# Altium integrated library Chip.IntLib: 52 symbols
Pins are listed as number, name and electrical type; pins without a type are passive.

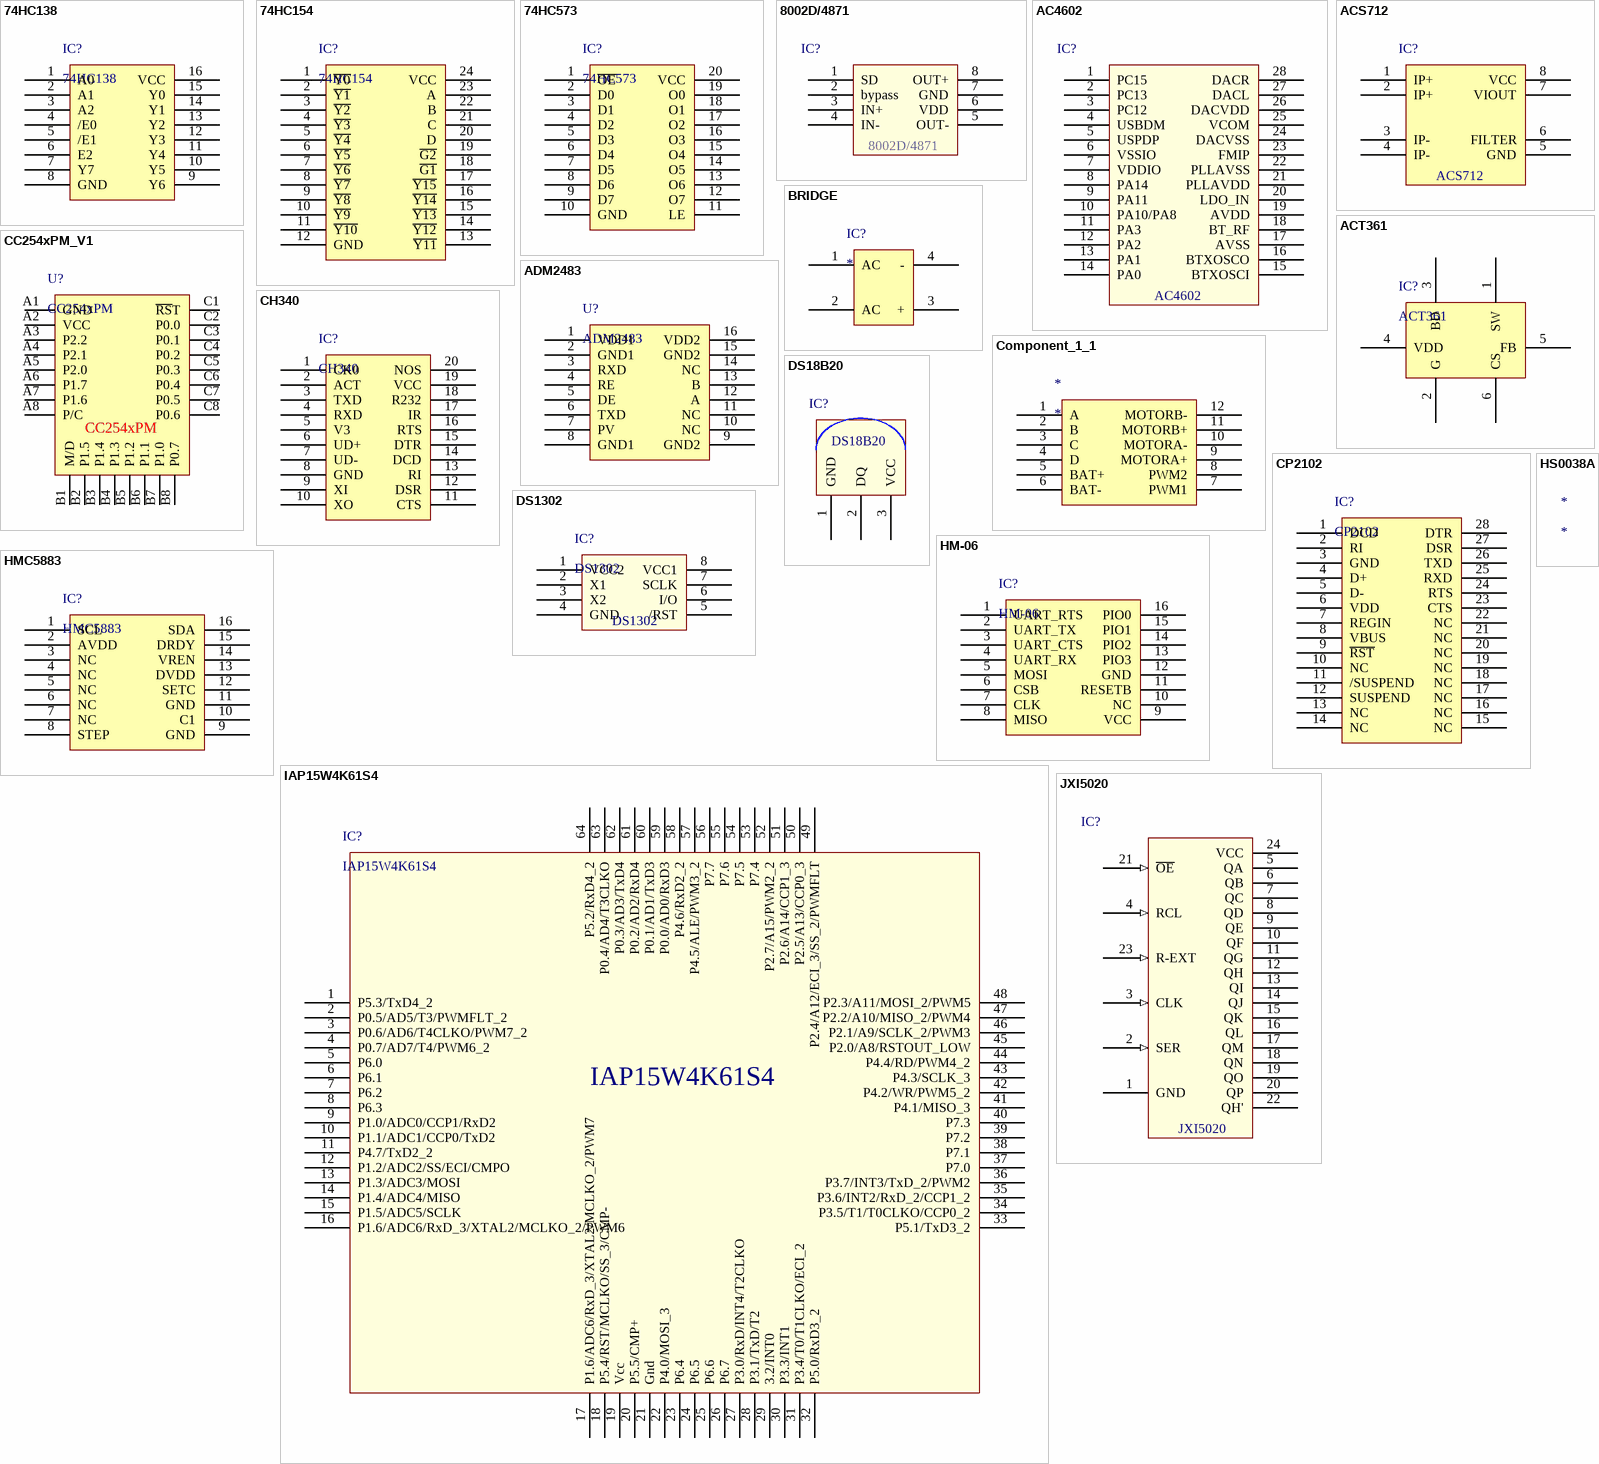
[diagram p0: symbols 74HC138 to JXI5020]

## 74HC138
designator IC?
三八译码器
footprint SOP16_39
pins: 1 A0, 2 A1, 3 A2, 4 /E0, 5 /E1, 6 E2, 7 Y7, 8 GND, 9 Y6, 10 Y5, 11 Y4, 12 Y3, 13 Y2, 14 Y1, 15 Y0, 16 VCC

## 74HC154
designator IC?
4-16译码器
pins: 1 ~{Y0}, 2 ~{Y1}, 3 ~{Y2}, 4 ~{Y3}, 5 ~{Y4}, 6 ~{Y5}, 7 ~{Y6}, 8 ~{Y7}, 9 ~{Y8}, 10 ~{Y9}, 11 ~{Y10}, 12 GND, 13 ~{Y11}, 14 ~{Y12}, 15 ~{Y13}, 16 ~{Y14}, 17 ~{Y15}, 18 ~{G1}, 19 ~{G2}, 20 D, 21 C, 22 B, 23 A, 24 VCC

## 74HC573
designator IC?
锁存器
footprint SOP20_75
pins: 1 ~{OE}, 2 D0, 3 D1, 4 D2, 5 D3, 6 D4, 7 D5, 8 D6, 9 D7, 10 GND, 11 LE, 12 O7, 13 O6, 14 O5, 15 O4, 16 O3, 17 O2, 18 O1, 19 O0, 20 VCC

## 8002D/4871
designator IC?  (value not drawn)
功放
footprint SOP8_39
pins: 1 SD, 2 bypass, 3 IN+, 4 IN-, 5 OUT-, 6 VDD, 7 GND, 8 OUT+

## AC4602
designator IC?  (value not drawn)
蓝牙芯片
footprint SSOP28
pins: 1 PC15, 2 PC13, 3 PC12, 4 USBDM, 5 USPDP, 6 VSSIO, 7 VDDIO, 8 PA14, 9 PA11, 10 PA10/PA8, 11 PA3, 12 PA2, 13 PA1, 14 PA0, 15 BTXOSCI, 16 BTXOSCO, 17 AVSS, 18 BT_RF, 19 AVDD, 20 LDO_IN, 21 PLLAVDD, 22 PLLAVSS, 23 FMIP, 24 DACVSS, 25 VCOM, 26 DACVDD, 27 DACL, 28 DACR

## ACS712
designator IC?  (value not drawn)
电流传感器
footprint SOP8_39
pins: 1 IP+, 2 IP+, 3 IP-, 4 IP-, 5 GND, 6 FILTER, 7 VIOUT, 8 VCC

## ACT361
designator IC?
开关稳压器
pins: 1 SW, 2 G, 3 BD, 4 VDD, 5 FB, 6 CS

## ADM2483
designator U?
隔离485
footprint SOP16_75
pins: 1 VDD1, 2 GND1, 3 RXD, 4 RE, 5 DE, 6 TXD, 7 PV, 8 GND1, 9 GND2, 10 NC, 11 NC, 12 A, 13 B, 14 NC, 15 GND2, 16 VDD2

## BRIDGE
designator IC?
整流桥
footprint MB6S
pins: 1 AC, 2 AC, 3 +, 4 -

## CC254xPM_V1
designator U?, comment CC254xPM
蓝牙4.0
footprint CC254xPMV1
footprint CC254xPMv2
pins: A1 GND, A2 VCC, A3 P2.2, A4 P2.1, A5 P2.0, A6 P1.7, A7 P1.6, A8 P/C, B1 M/D, B2 P1.5, B3 P1.4, B4 P1.3, B5 P1.2, B6 P1.1, B7 P1.0, B8 P0.7, C1 ~{RS}T, C2 P0.0, C3 P0.1, C4 P0.2, C5 P0.3, C6 P0.4, C7 P0.5, C8 P0.6

## CH340
designator IC?
串口转换
footprint SSOP20
pins: 1 CK0, 2 ACT, 3 TXD, 4 RXD, 5 V3, 6 UD+, 7 UD-, 8 GND, 9 XI, 10 XO, 11 CTS, 12 DSR, 13 RI, 14 DCD, 15 DTR, 16 RTS, 17 IR, 18 R232, 19 VCC, 20 NOS

## Component_1_1
designator *
pins: 1 A, 2 B, 3 C, 4 D, 5 BAT+, 6 BAT-, 7 PWM1, 8 PWM2, 9 MOTORA+, 10 MOTORA-, 11 MOTORB+, 12 MOTORB-

## CP2102
designator IC?
串口转换
footprint QFN28
pins: 1 DCD, 2 RI, 3 GND, 4 D+, 5 D-, 6 VDD, 7 REGIN, 8 VBUS, 9 ~{RST}, 10 NC, 11 /SUSPEND, 12 SUSPEND, 13 NC, 14 NC, 15 NC, 16 NC, 17 NC, 18 NC, 19 NC, 20 NC, 21 NC, 22 NC, 23 CTS, 24 RTS, 25 RXD, 26 TXD, 27 DSR, 28 DTR

## DS18B20
designator IC?  (value not drawn)
温度传感器
footprint TO-92
pins: 1 GND, 2 DQ, 3 VCC

## DS1302
designator IC?
时钟芯片
footprint SOP8_39
pins: 1 VCC2, 2 X1, 3 X2, 4 GND, 5 /RST, 6 I/O (oe), 7 SCLK (oe), 8 VCC1 (oe)

## HM-06
designator IC?
蓝牙模块
footprint HM-06
pins: 1 UART_RTS, 2 UART_TX, 3 UART_CTS, 4 UART_RX, 5 MOSI, 6 CSB, 7 CLK, 8 MISO, 9 VCC, 10 NC, 11 RESETB, 12 GND, 13 PIO3, 14 PIO2, 15 PIO1, 16 PIO0

## HMC5883
designator IC?
电子罗盘
footprint LCC16 (LCC, 16-Pins, Body 3.0x3.0mm (max), Pitch 0.50mm, IPC Medium Density)
pins: 1 SCL, 2 AVDD, 3 NC, 4 NC, 5 NC, 6 NC, 7 NC, 8 STEP, 9 GND, 10 C1, 11 GND, 12 SETC, 13 DVDD, 14 VREN, 15 DRDY, 16 SDA

## HS0038A
designator *

## IAP15W4K61S4
designator IC?
单片机
footprint LQFP64
pins: 1 P5.3/TxD4_2, 2 P0.5/AD5/T3/PWMFLT_2, 3 P0.6/AD6/T4CLKO/PWM7_2, 4 P0.7/AD7/T4/PWM6_2, 5 P6.0, 6 P6.1, 7 P6.2, 8 P6.3, 9 P1.0/ADC0/CCP1/RxD2, 10 P1.1/ADC1/CCP0/TxD2, 11 P4.7/TxD2_2, 12 P1.2/ADC2/SS/ECI/CMPO, 13 P1.3/ADC3/MOSI, 14 P1.4/ADC4/MISO, 15 P1.5/ADC5/SCLK, 16 P1.6/ADC6/RxD_3/XTAL2/MCLKO_2/PWM6, 17 P1.6/ADC6/RxD_3/XTAL2/MCLKO_2/PWM7, 18 P5.4/RST/MCLKO/SS_3/CMP-, 19 Vcc, 20 P5.5/CMP+, 21 Gnd, 22 P4.0/MOSI_3, 23 P6.4, 24 P6.5, 25 P6.6, 26 P6.7, 27 P3.0/RxD/INT4/T2CLKO, 28 P3.1/TxD/T2, 29 3.2/INT0, 30 P3.3/INT1, 31 P3.4/T0/T1CLKO/ECI_2, 32 P5.0/RxD3_2, 33 P5.1/TxD3_2, 34 P3.5/T1/T0CLKO/CCP0_2, 35 P3.6/INT2/RxD_2/CCP1_2, 36 P3.7/INT3/TxD_2/PWM2, 37 P7.0, 38 P7.1, 39 P7.2, 40 P7.3, 41 P4.1/MISO_3, 42 P4.2/WR/PWM5_2, 43 P4.3/SCLK_3, 44 P4.4/RD/PWM4_2, 45 P2.0/A8/RSTOUT_LOW, 46 P2.1/A9/SCLK_2/PWM3, 47 P2.2/A10/MISO_2/PWM4, 48 P2.3/A11/MOSI_2/PWM5, 49 P2.4/A12/ECI_3/SS_2/PWMFLT, 50 P2.5/A13/CCP0_3, 51 P2.6/A14/CCP1_3, 52 P2.7/A15/PWM2_2, 53 P7.4, 54 P7.5, 55 P7.6, 56 P7.7, 57 P4.5/ALE/PWM3_2, 58 P4.6/RxD2_2, 59 P0.0/AD0/RxD3, 60 P0.1/AD1/TxD3, 61 P0.2/AD2/RxD4, 62 P0.3/AD3/TxD4, 63 P0.4/AD4/T3CLKO, 64 P5.2/RxD4_2

## JXI5020
designator IC?  (value not drawn)
16位恒流驱动
footprint JXI5020 (SOP, 24-Leads, Body 13.0x6.0mm (max), Pitch 1.00mm, IPC Medium Density)
pins: 1 GND, 2 SER (in), 3 CLK (in), 4 RCL (in), 5 QA, 6 QB, 7 QC, 8 QD, 9 QE, 10 QF, 11 QG, 12 QH, 13 QI, 14 QJ, 15 QK, 16 QL, 17 QM, 18 QN, 19 QO, 20 QP, 21 ~{OE} (in), 22 QH', 23 R-EXT (in), 24 VCC

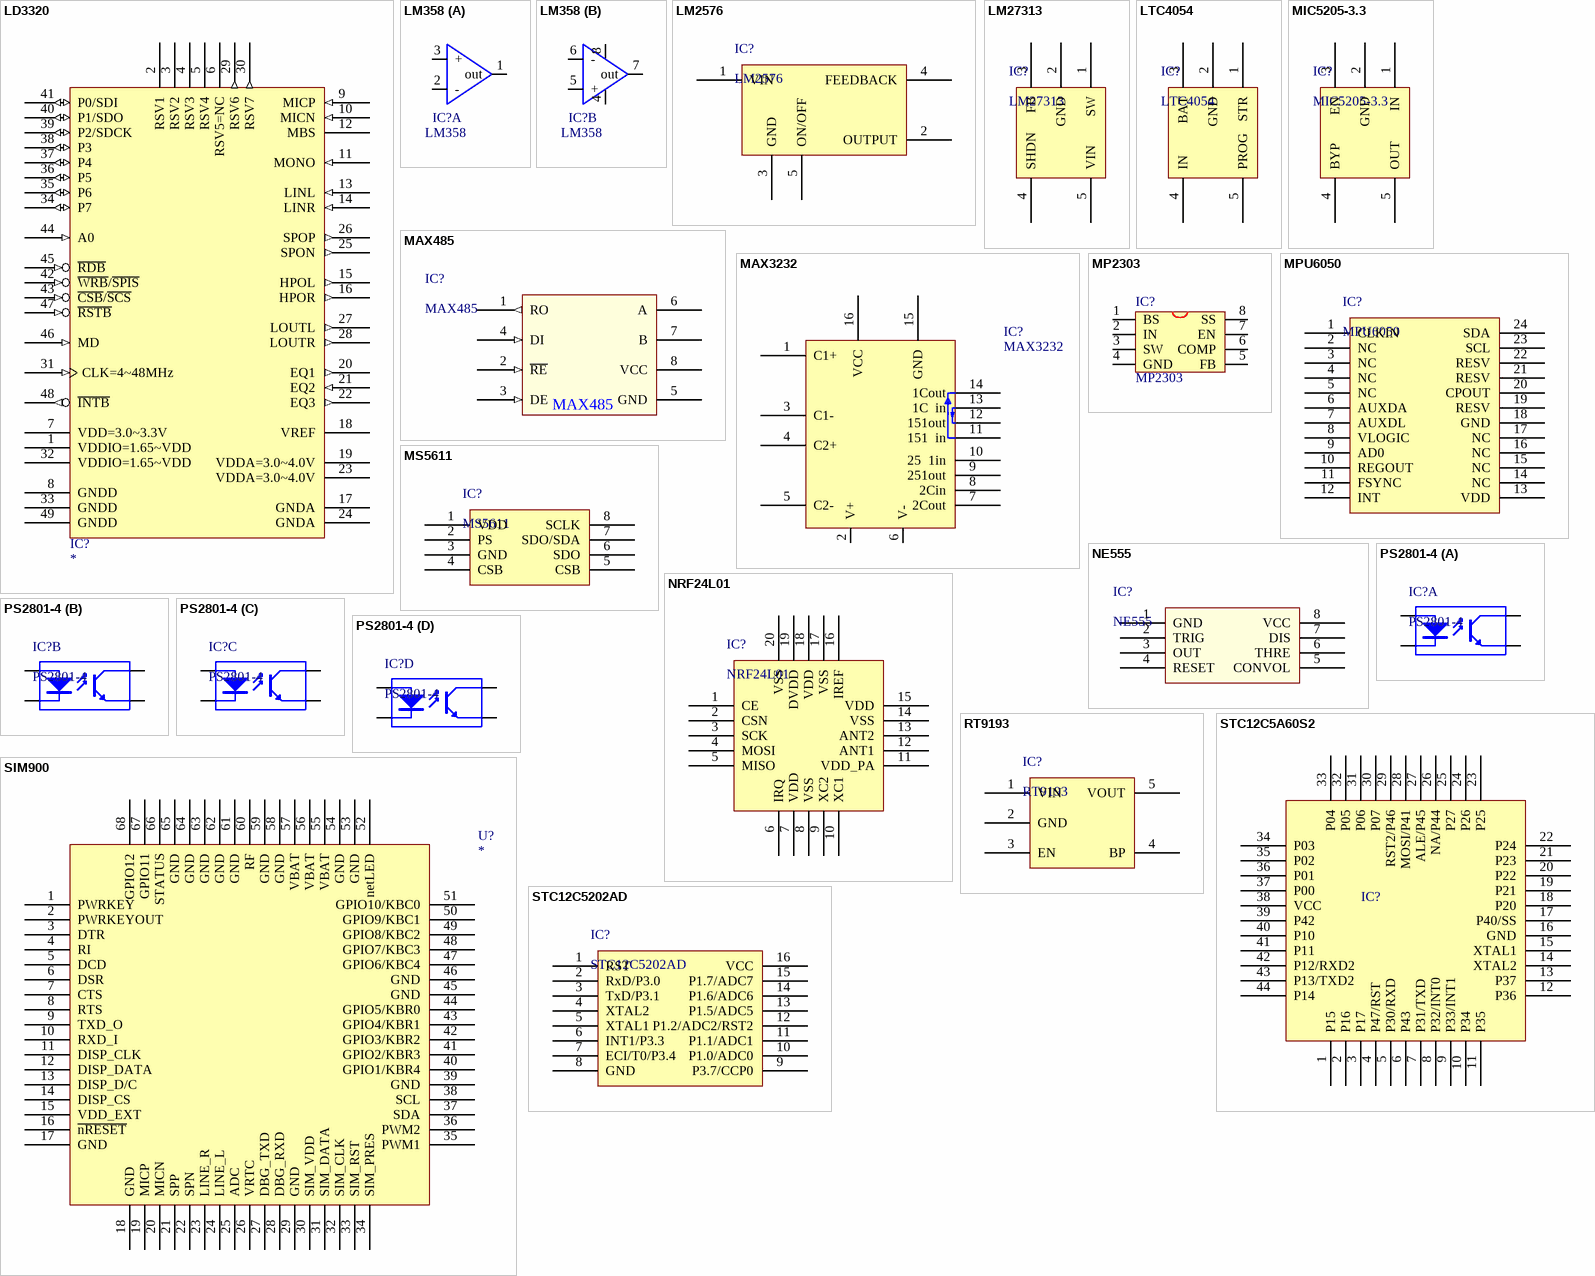
[diagram p1: symbols LD3320 to STC12C5202AD]

## LD3320
designator IC?
语音识别
footprint QFN48
pins: 1 VDDIO=1.65~VDD (power), 2 RSV1, 3 RSV2, 4 RSV3, 5 RSV4, 6 RSV5=NC, 7 VDD=3.0~3.3V (power), 8 GNDD (power), 9 MICP (in), 10 MICN (in), 11 MONO (in), 12 MBS, 13 LINL (in), 14 LINR (in), 15 HPOL (out), 16 HPOR (out), 17 GNDA (power), 18 VREF (power), 19 VDDA=3.0~4.0V (power), 20 EQ1 (out), 21 EQ2 (in), 22 EQ3 (out), 23 VDDA=3.0~4.0V (power), 24 GNDA (power), 25 SPON (out), 26 SPOP (out), 27 LOUTL (out), 28 LOUTR (out), 29 RSV6 (out), 30 RSV7 (out), 31 CLK=4~48MHz (in), 32 VDDIO=1.65~VDD (power), 33 GNDD (power), 34 P7 (io), 35 P6 (io), 36 P5 (io), 37 P4 (io), 38 P3 (io), 39 P2/SDCK (io), 40 P1/SDO (io), 41 P0/SDI (io), 42 ~{WRB}/~{SPIS} (in), 43 ~{CSB}/~{SCS} (in), 44 A0 (in), 45 ~{RDB} (in), 46 MD (in), 47 ~{RSTB} (in), 48 ~{INTB} (out), 49 GNDD (power)

## LM358
designator IC?
footprint sop8
footprint DIP8
part A pins: 1 out, 2 -, 3 +
part B pins: 4 GND, 5 +, 6 -, 7 out, 8 vcc

## LM2576
designator IC?
稳压
footprint TO-263-5L
pins: 1 VIN, 2 OUTPUT, 3 GND, 4 FEEDBACK, 5 ON/OFF

## LM27313
designator IC?
升压
footprint SOT-23-5
pins: 1 SW, 2 GND, 3 FB, 4 SHDN, 5 VIN

## LTC4054
designator IC?
锂电池管理
footprint SOT-23-5
pins: 1 STR, 2 GND, 3 BAT, 4 IN, 5 PROG

## MAX485
designator IC?
pins: 1 RO (out), 2 ~{RE} (in), 3 DE (in), 4 DI (in), 5 GND, 6 A, 7 B, 8 VCC

## MAX3232
designator IC?
串口转换; MAX232: 5V供电; MAX3232: +3.3V--5v供电
footprint DIP16
footprint SOP16
pins: 1 C1+, 2 V+, 3 C1-, 4 C2+, 5 C2-, 6 V-, 7 2Cout, 8 2Cin, 9 251out, 10 25  1in, 11 151  in, 12 151out, 13 1C  in, 14 1Cout, 15 GND, 16 VCC

## MIC5205-3.3
designator IC?
稳压
footprint SOT-23-5
pins: 1 IN, 2 GND, 3 EN, 4 BYP, 5 OUT

## MP2303
designator IC?
稳压
footprint SOP8_39
pins: 1 BS, 2 IN, 3 SW, 4 GND, 5 FB, 6 COMP, 7 EN, 8 SS
2 alternate drawings of the same symbol

## MPU6050
designator IC?
三轴陀螺仪
footprint QFN24
pins: 1 CLKIN, 2 NC, 3 NC, 4 NC, 5 NC, 6 AUXDA, 7 AUXDL, 8 VLOGIC, 9 AD0, 10 REGOUT, 11 FSYNC, 12 INT, 13 VDD, 14 NC, 15 NC, 16 NC, 17 NC, 18 GND, 19 RESV, 20 CPOUT, 21 RESV, 22 RESV, 23 SCL, 24 SDA

## MS5611
designator IC?
大气压芯片
footprint SON8
pins: 1 VDD, 2 PS, 3 GND, 4 CSB, 5 CSB, 6 SDO, 7 SDO/SDA, 8 SCLK

## NE555
designator IC?
时基集成
footprint SOP8_39
pins: 1 GND, 2 TRIG, 3 OUT, 4 RESET, 5 CONVOL, 6 THRE, 7 DIS, 8 VCC

## NRF24L01
designator IC?
无线收发
footprint QFN20
pins: 1 CE, 2 CSN, 3 SCK, 4 MOSI, 5 MISO, 6 IRQ, 7 VDD, 8 VSS, 9 XC2, 10 XC1, 11 VDD_PA, 12 ANT1, 13 ANT2, 14 VSS, 15 VDD, 16 IREF, 17 VSS, 18 VDD, 19 DVDD, 20 VSS

## PS2801-4
designator IC?
光耦
footprint SOP16_39
part A pins: 1, 2, 15, 16
part B pins: 3, 4, 13, 14
part C pins: 5, 6, 11, 12
part D pins: 7, 8, 9, 10

## RT9193
designator IC?
LDO稳压
footprint SOT-23-5
pins: 1 VIN, 2 GND, 3 EN, 4 BP, 5 VOUT

## SIM900
designator U?
GSMоƬ
footprint SIM900A
pins: 1 PWRKEY, 2 PWRKEYOUT, 3 DTR, 4 RI, 5 DCD, 6 DSR, 7 CTS, 8 RTS, 9 TXD_O, 10 RXD_I, 11 DISP_CLK, 12 DISP_DATA, 13 DISP_D/C, 14 DISP_CS, 15 VDD_EXT, 16 ~{nRESET}, 17 GND, 18 GND, 19 MICP, 20 MICN, 21 SPP, 22 SPN, 23 LINE_R, 24 LINE_L, 25 ADC, 26 VRTC, 27 DBG_TXD, 28 DBG_RXD, 29 GND, 30 SIM_VDD, 31 SIM_DATA, 32 SIM_CLK, 33 SIM_RST, 34 SIM_PRES, 35 PWM1, 36 PWM2, 37 SDA, 38 SCL, 39 GND, 40 GPIO1/KBR4, 41 GPIO2/KBR3, 42 GPIO3/KBR2, 43 GPIO4/KBR1, 44 GPIO5/KBR0, 45 GND, 46 GND, 47 GPIO6/KBC4, 48 GPIO7/KBC3, 49 GPIO8/KBC2, 50 GPIO9/KBC1, 51 GPIO10/KBC0, 52 netLED, 53 GND, 54 GND, 55 VBAT, 56 VBAT, 57 VBAT, 58 GND, 59 GND, 60 RF, 61 GND, 62 GND, 63 GND, 64 GND, 65 GND, 66 STATUS, 67 GPIO11, 68 GPIO12
2 alternate drawings of the same symbol

## STC12C5A60S2
designator IC?, comment STC12C5A60S2 LQFP44  (value not drawn)
单片机
footprint LQFP44 (TQFP, 44-Leads, Body 12.0x12.0mm (m)
3D model PQF-44 (PCB3D Model)
pins: 1 P15, 2 P16, 3 P17, 4 P47/RST, 5 P30/RXD, 6 P43, 7 P31/TXD, 8 P32/INT0, 9 P33/INT1, 10 P34, 11 P35, 12 P36, 13 P37, 14 XTAL2, 15 XTAL1, 16 GND, 17 P40/SS, 18 P20, 19 P21, 20 P22, 21 P23, 22 P24, 23 P25, 24 P26, 25 P27, 26 NA/P44, 27 ALE/P45, 28 MOSI/P41, 29 RST2/P46, 30 P07, 31 P06, 32 P05, 33 P04, 34 P03, 35 P02, 36 P01, 37 P00, 38 VCC, 39 P42, 40 P10, 41 P11, 42 P12/RXD2, 43 P13/TXD2, 44 P14

## STC12C5202AD
designator IC?
单片机
footprint SOIC16_39MM
pins: 1 RST, 2 RxD/P3.0, 3 TxD/P3.1, 4 XTAL2, 5 XTAL1, 6 INT1/P3.3, 7 ECI/T0/P3.4, 8 GND, 9 P3.7/CCP0, 10 P1.0/ADC0, 11 P1.1/ADC1, 12 P1.2/ADC2/RST2, 13 P1.5/ADC5, 14 P1.6/ADC6, 15 P1.7/ADC7, 16 VCC

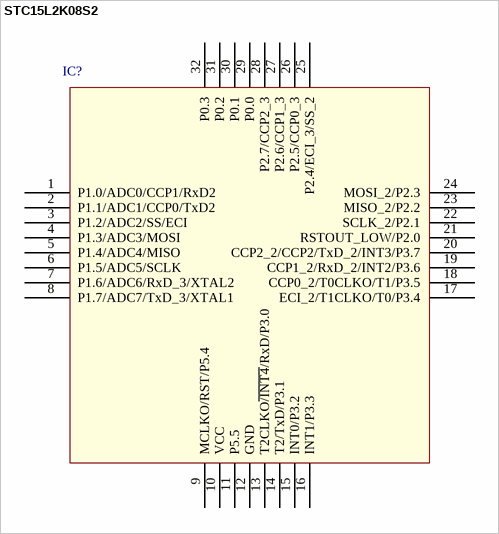
[diagram p2: symbol STC15L2K08S2]

## STC15L2K08S2
designator IC?  (value not drawn)
单片机
footprint LQFP32
pins: 1 P1.0/ADC0/CCP1/RxD2, 2 P1.1/ADC1/CCP0/TxD2, 3 P1.2/ADC2/SS/ECI, 4 P1.3/ADC3/MOSI, 5 P1.4/ADC4/MISO, 6 P1.5/ADC5/SCLK, 7 P1.6/ADC6/RxD_3/XTAL2, 8 P1.7/ADC7/TxD_3/XTAL1, 9 MCLKO/RST/P5.4, 10 VCC, 11 P5.5, 12 GND, 13 T2CLKO~{/INT4}/RxD/P3.0, 14 T2/TxD/P3.1, 15 INT0/P3.2, 16 INT1/P3.3, 17 ECI_2/T1CLKO/T0/P3.4, 18 CCP0_2/T0CLKO/T1/P3.5, 19 CCP1_2/RxD_2/INT2/P3.6, 20 CCP2_2/CCP2/TxD_2/INT3/P3.7, 21 RSTOUT_LOW/P2.0, 22 SCLK_2/P2.1, 23 MISO_2/P2.2, 24 MOSI_2/P2.3, 25 P2.4/ECI_3/SS_2, 26 P2.5/CCP0_3, 27 P2.6/CCP1_3, 28 P2.7/CCP2_3, 29 P0.0, 30 P0.1, 31 P0.2, 32 P0.3

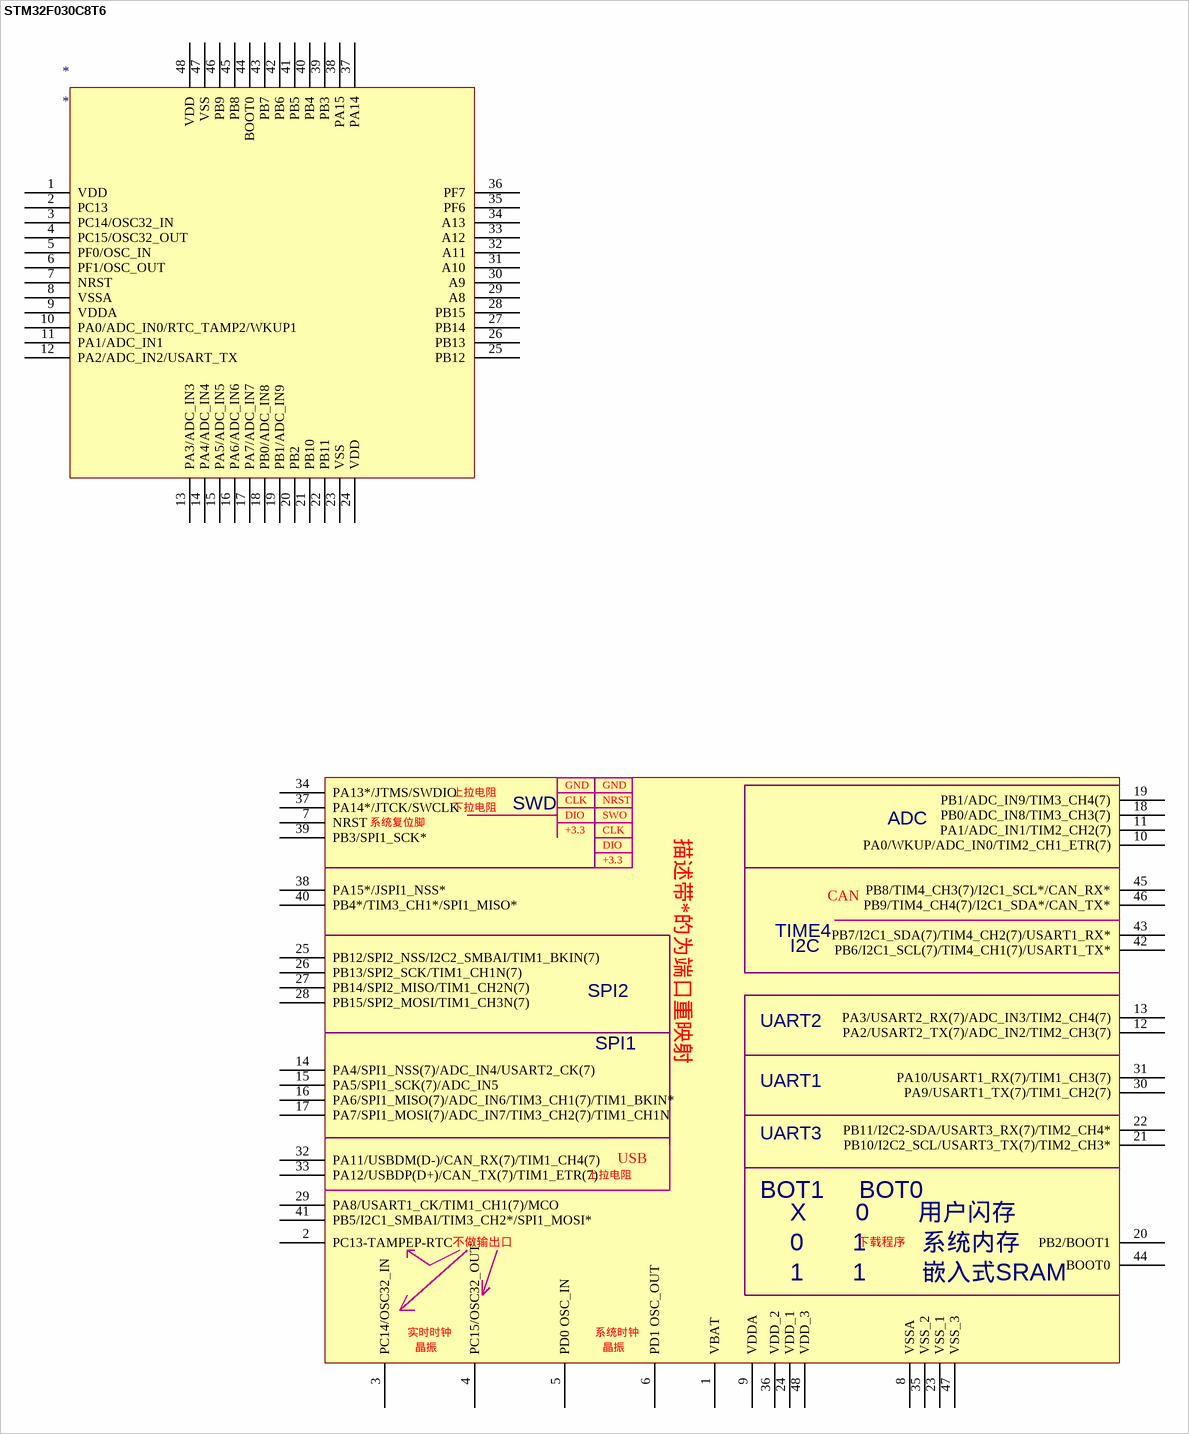
[diagram p3: symbol STM32F030C8T6]

## STM32F030C8T6
designator *
pins: 1 VDD, 1 VBAT, 2 PC13, 2 PC13-TAMPEP-RTC, 3 PC14/OSC32_IN, 3 PC14/OSC32_IN, 4 PC15/OSC32_OUT, 4 PC15/OSC32_OUT, 5 PF0/OSC_IN, 5 PD0 OSC_IN, 6 PF1/OSC_OUT, 6 PD1 OSC_OUT, 7 NRST, 7 NRST, 8 VSSA, 8 VSSA, 9 VDDA, 9 VDDA, 10 PA0/ADC_IN0/RTC_TAMP2/WKUP1, 10 PA0/WKUP/ADC_IN0/TIM2_CH1_ETR(7), 11 PA1/ADC_IN1, 11 PA1/ADC_IN1/TIM2_CH2(7), 12 PA2/ADC_IN2/USART_TX, 12 PA2/USART2_TX(7)/ADC_IN2/TIM2_CH3(7), 13 PA3/ADC_IN3, 13 PA3/USART2_RX(7)/ADC_IN3/TIM2_CH4(7), 14 PA4/ADC_IN4, 14 PA4/SPI1_NSS(7)/ADC_IN4/USART2_CK(7), 15 PA5/ADC_IN5, 15 PA5/SPI1_SCK(7)/ADC_IN5, 16 PA6/ADC_IN6, 16 PA6/SPI1_MISO(7)/ADC_IN6/TIM3_CH1(7)/TIM1_BKIN*, 17 PA7/ADC_IN7, 17 PA7/SPI1_MOSI(7)/ADC_IN7/TIM3_CH2(7)/TIM1_CH1N, 18 PB0/ADC_IN8, 18 PB0/ADC_IN8/TIM3_CH3(7), 19 PB1/ADC_IN9, 19 PB1/ADC_IN9/TIM3_CH4(7), 20 PB2, 20 PB2/BOOT1, 21 PB10, 21 PB10/I2C2_SCL/USART3_TX(7)/TIM2_CH3*, 22 PB11, 22 PB11/I2C2-SDA/USART3_RX(7)/TIM2_CH4*, 23 VSS, 23 VSS_1, 24 VDD, 24 VDD_1, 25 PB12, 25 PB12/SPI2_NSS/I2C2_SMBAI/TIM1_BKIN(7), 26 PB13, 26 PB13/SPI2_SCK/TIM1_CH1N(7), 27 PB14, 27 PB14/SPI2_MISO/TIM1_CH2N(7), 28 PB15, 28 PB15/SPI2_MOSI/TIM1_CH3N(7), 29 A8, 29 PA8/USART1_CK/TIM1_CH1(7)/MCO, 30 A9, 30 PA9/USART1_TX(7)/TIM1_CH2(7), 31 A10, 31 PA10/USART1_RX(7)/TIM1_CH3(7), 32 A11, 32 PA11/USBDM(D-)/CAN_RX(7)/TIM1_CH4(7), 33 A12, 33 PA12/USBDP(D+)/CAN_TX(7)/TIM1_ETR(7), 34 A13, 34 PA13*/JTMS/SWDIO, 35 PF6, 35 VSS_2, 36 PF7, 36 VDD_2, 37 PA14, 37 PA14*/JTCK/SWCLK, 38 PA15, 38 PA15*/JSPI1_NSS*, 39 PB3, 39 PB3/SPI1_SCK*, 40 PB4, 40 PB4*/TIM3_CH1*/SPI1_MISO*, 41 PB5, 41 PB5/I2C1_SMBAI/TIM3_CH2*/SPI1_MOSI*, 42 PB6, 42 PB6/I2C1_SCL(7)/TIM4_CH1(7)/USART1_TX*, 43 PB7, 43 PB7/I2C1_SDA(7)/TIM4_CH2(7)/USART1_RX*, 44 BOOT0, 44 BOOT0, 45 PB8, 45 PB8/TIM4_CH3(7)/I2C1_SCL*/CAN_RX*, 46 PB9, 46 PB9/TIM4_CH4(7)/I2C1_SDA*/CAN_TX*, 47 VSS, 47 VSS_3, 48 VDD, 48 VDD_3
text: GND; 上拉电阻; CLK; 下拉电阻; SWD; DIO; SWO; 系统复位脚; ADC; +3.3; 描述带*的为端口重映射; CAN; TIME4; I2C; SPI2; UART2; SPI1; UART1; UART3; USB; BOT1     BOT0; X       0       用户闪存; 不做输出口; 下载程序; 0       1        系统内存; 1       1        嵌入式SRAM; 实时时钟; 系统时钟; 晶振

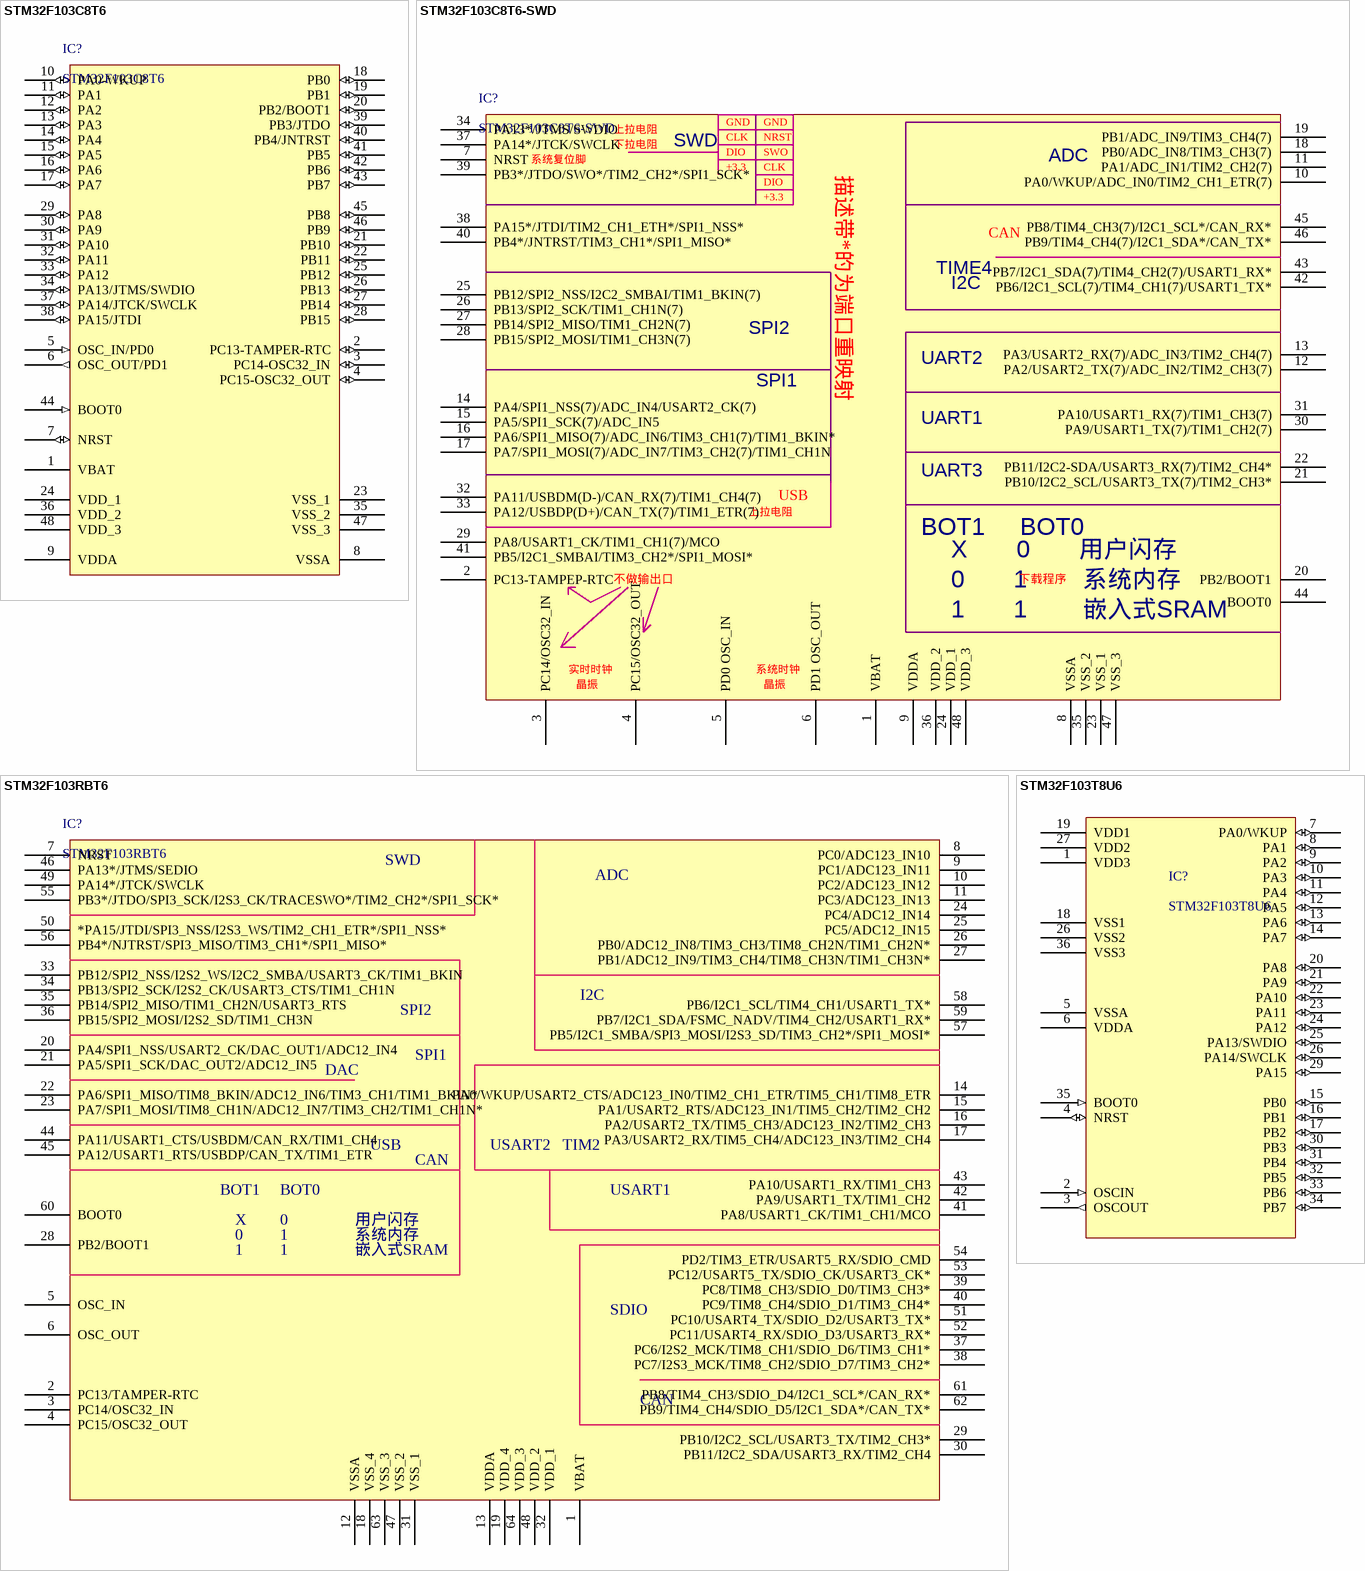
[diagram p4: symbols STM32F103C8T6 to STM32F103T8U6]

## STM32F103C8T6
designator IC?
单片机; Published: 30-May-2008; DatasheetVersion: rev6, Mar-2008; PackageVersion: Mar-2008; PackageReference: LQFP48; Publisher: Altium Limited; PackageDescription: 48-Pin Low-Profile Quad Flat Pack, 7 x 7 mm Body, 0.5 mm Pitch (LQFP48); ComponentLink1Description: Manufacturer Link; ComponentLink1URL: www.st.com/stm32; ComponentLink2Description: Datasheet; ComponentLink2URL: http://www.st.com/stonline/products/literature/ds/13587.pdf
footprint LQFP48
pins: 1 VBAT (power), 2 PC13-TAMPER-RTC (io), 3 PC14-OSC32_IN (io), 4 PC15-OSC32_OUT (io), 5 OSC_IN/PD0 (in), 6 OSC_OUT/PD1 (out), 7 NRST (io), 8 VSSA (power), 9 VDDA (power), 10 PA0-WKUP (io), 11 PA1 (io), 12 PA2 (io), 13 PA3 (io), 14 PA4 (io), 15 PA5 (io), 16 PA6 (io), 17 PA7 (io), 18 PB0 (io), 19 PB1 (io), 20 PB2/BOOT1 (io), 21 PB10 (io), 22 PB11 (io), 23 VSS_1 (power), 24 VDD_1 (power), 25 PB12 (io), 26 PB13 (io), 27 PB14 (io), 28 PB15 (io), 29 PA8 (io), 30 PA9 (io), 31 PA10 (io), 32 PA11 (io), 33 PA12 (io), 34 PA13/JTMS/SWDIO (io), 35 VSS_2 (power), 36 VDD_2 (power), 37 PA14/JTCK/SWCLK (io), 38 PA15/JTDI (io), 39 PB3/JTDO (io), 40 PB4/JNTRST (io), 41 PB5 (io), 42 PB6 (io), 43 PB7 (io), 44 BOOT0 (in), 45 PB8 (io), 46 PB9 (io), 47 VSS_3 (power), 48 VDD_3 (power)

## STM32F103C8T6-SWD
designator IC?
单片机
footprint LQFP48
3D model LQFP-48A (PCB3D Model)
pins: 1 VBAT, 2 PC13-TAMPEP-RTC, 3 PC14/OSC32_IN, 4 PC15/OSC32_OUT, 5 PD0 OSC_IN, 6 PD1 OSC_OUT, 7 NRST, 8 VSSA, 9 VDDA, 10 PA0/WKUP/ADC_IN0/TIM2_CH1_ETR(7), 11 PA1/ADC_IN1/TIM2_CH2(7), 12 PA2/USART2_TX(7)/ADC_IN2/TIM2_CH3(7), 13 PA3/USART2_RX(7)/ADC_IN3/TIM2_CH4(7), 14 PA4/SPI1_NSS(7)/ADC_IN4/USART2_CK(7), 15 PA5/SPI1_SCK(7)/ADC_IN5, 16 PA6/SPI1_MISO(7)/ADC_IN6/TIM3_CH1(7)/TIM1_BKIN*, 17 PA7/SPI1_MOSI(7)/ADC_IN7/TIM3_CH2(7)/TIM1_CH1N, 18 PB0/ADC_IN8/TIM3_CH3(7), 19 PB1/ADC_IN9/TIM3_CH4(7), 20 PB2/BOOT1, 21 PB10/I2C2_SCL/USART3_TX(7)/TIM2_CH3*, 22 PB11/I2C2-SDA/USART3_RX(7)/TIM2_CH4*, 23 VSS_1, 24 VDD_1, 25 PB12/SPI2_NSS/I2C2_SMBAI/TIM1_BKIN(7), 26 PB13/SPI2_SCK/TIM1_CH1N(7), 27 PB14/SPI2_MISO/TIM1_CH2N(7), 28 PB15/SPI2_MOSI/TIM1_CH3N(7), 29 PA8/USART1_CK/TIM1_CH1(7)/MCO, 30 PA9/USART1_TX(7)/TIM1_CH2(7), 31 PA10/USART1_RX(7)/TIM1_CH3(7), 32 PA11/USBDM(D-)/CAN_RX(7)/TIM1_CH4(7), 33 PA12/USBDP(D+)/CAN_TX(7)/TIM1_ETR(7), 34 PA13*/JTMS/SWDIO, 35 VSS_2, 36 VDD_2, 37 PA14*/JTCK/SWCLK, 38 PA15*/JTDI/TIM2_CH1_ETH*/SPI1_NSS*, 39 PB3*/JTDO/SWO*/TIM2_CH2*/SPI1_SCK*, 40 PB4*/JNTRST/TIM3_CH1*/SPI1_MISO*, 41 PB5/I2C1_SMBAI/TIM3_CH2*/SPI1_MOSI*, 42 PB6/I2C1_SCL(7)/TIM4_CH1(7)/USART1_TX*, 43 PB7/I2C1_SDA(7)/TIM4_CH2(7)/USART1_RX*, 44 BOOT0, 45 PB8/TIM4_CH3(7)/I2C1_SCL*/CAN_RX*, 46 PB9/TIM4_CH4(7)/I2C1_SDA*/CAN_TX*, 47 VSS_3, 48 VDD_3
text: GND; 上拉电阻; CLK; 下拉电阻; SWD; DIO; SWO; 系统复位脚; ADC; +3.3; 描述带*的为端口重映射; CAN; TIME4; I2C; SPI2; UART2; SPI1; UART1; UART3; USB; BOT1     BOT0; X       0       用户闪存; 不做输出口; 下载程序; 0       1        系统内存; 1       1        嵌入式SRAM; 实时时钟; 系统时钟; 晶振

## STM32F103RBT6
designator IC?
单片机
footprint LQFP64
pins: 1 VBAT, 2 PC13/TAMPER-RTC, 3 PC14/OSC32_IN, 4 PC15/OSC32_OUT, 5 OSC_IN, 6 OSC_OUT, 7 NRST, 8 PC0/ADC123_IN10, 9 PC1/ADC123_IN11, 10 PC2/ADC123_IN12, 11 PC3/ADC123_IN13, 12 VSSA, 13 VDDA, 14 PA0/WKUP/USART2_CTS/ADC123_IN0/TIM2_CH1_ETR/TIM5_CH1/TIM8_ETR, 15 PA1/USART2_RTS/ADC123_IN1/TIM5_CH2/TIM2_CH2, 16 PA2/USART2_TX/TIM5_CH3/ADC123_IN2/TIM2_CH3, 17 PA3/USART2_RX/TIM5_CH4/ADC123_IN3/TIM2_CH4, 18 VSS_4, 19 VDD_4, 20 PA4/SPI1_NSS/USART2_CK/DAC_OUT1/ADC12_IN4, 21 PA5/SPI1_SCK/DAC_OUT2/ADC12_IN5, 22 PA6/SPI1_MISO/TIM8_BKIN/ADC12_IN6/TIM3_CH1/TIM1_BKIN*, 23 PA7/SPI1_MOSI/TIM8_CH1N/ADC12_IN7/TIM3_CH2/TIM1_CH1N*, 24 PC4/ADC12_IN14, 25 PC5/ADC12_IN15, 26 PB0/ADC12_IN8/TIM3_CH3/TIM8_CH2N/TIM1_CH2N*, 27 PB1/ADC12_IN9/TIM3_CH4/TIM8_CH3N/TIM1_CH3N*, 28 PB2/BOOT1, 29 PB10/I2C2_SCL/USART3_TX/TIM2_CH3*, 30 PB11/I2C2_SDA/USART3_RX/TIM2_CH4, 31 VSS_1, 32 VDD_1, 33 PB12/SPI2_NSS/I2S2_WS/I2C2_SMBA/USART3_CK/TIM1_BKIN, 34 PB13/SPI2_SCK/I2S2_CK/USART3_CTS/TIM1_CH1N, 35 PB14/SPI2_MISO/TIM1_CH2N/USART3_RTS, 36 PB15/SPI2_MOSI/I2S2_SD/TIM1_CH3N, 37 PC6/I2S2_MCK/TIM8_CH1/SDIO_D6/TIM3_CH1*, 38 PC7/I2S3_MCK/TIM8_CH2/SDIO_D7/TIM3_CH2*, 39 PC8/TIM8_CH3/SDIO_D0/TIM3_CH3*, 40 PC9/TIM8_CH4/SDIO_D1/TIM3_CH4*, 41 PA8/USART1_CK/TIM1_CH1/MCO, 42 PA9/USART1_TX/TIM1_CH2, 43 PA10/USART1_RX/TIM1_CH3, 44 PA11/USART1_CTS/USBDM/CAN_RX/TIM1_CH4, 45 PA12/USART1_RTS/USBDP/CAN_TX/TIM1_ETR, 46 PA13*/JTMS/SEDIO, 47 VSS_2, 48 VDD_2, 49 PA14*/JTCK/SWCLK, 50 *PA15/JTDI/SPI3_NSS/I2S3_WS/TIM2_CH1_ETR*/SPI1_NSS*, 51 PC10/USART4_TX/SDIO_D2/USART3_TX*, 52 PC11/USART4_RX/SDIO_D3/USART3_RX*, 53 PC12/USART5_TX/SDIO_CK/USART3_CK*, 54 PD2/TIM3_ETR/USART5_RX/SDIO_CMD, 55 PB3*/JTDO/SPI3_SCK/I2S3_CK/TRACESWO*/TIM2_CH2*/SPI1_SCK*, 56 PB4*/NJTRST/SPI3_MISO/TIM3_CH1*/SPI1_MISO*, 57 PB5/I2C1_SMBA/SPI3_MOSI/I2S3_SD/TIM3_CH2*/SPI1_MOSI*, 58 PB6/I2C1_SCL/TIM4_CH1/USART1_TX*, 59 PB7/I2C1_SDA/FSMC_NADV/TIM4_CH2/USART1_RX*, 60 BOOT0, 61 PB8/TIM4_CH3/SDIO_D4/I2C1_SCL*/CAN_RX*, 62 PB9/TIM4_CH4/SDIO_D5/I2C1_SDA*/CAN_TX*, 63 VSS_3, 64 VDD_3